# Altium footprint library MyComponents_v2.5.PcbLib: 403 footprints (part 2 of 26)
Each footprint in its own frame and in the unit in brackets; x right, y up, seen from the top. Pads: shape width x height; smd on the part's side, far side on the other; paste and mask are expansions set on the pad; w line width, h text height; cw(c..) or ccw(c..) is an arc to the next point about the centre after c.
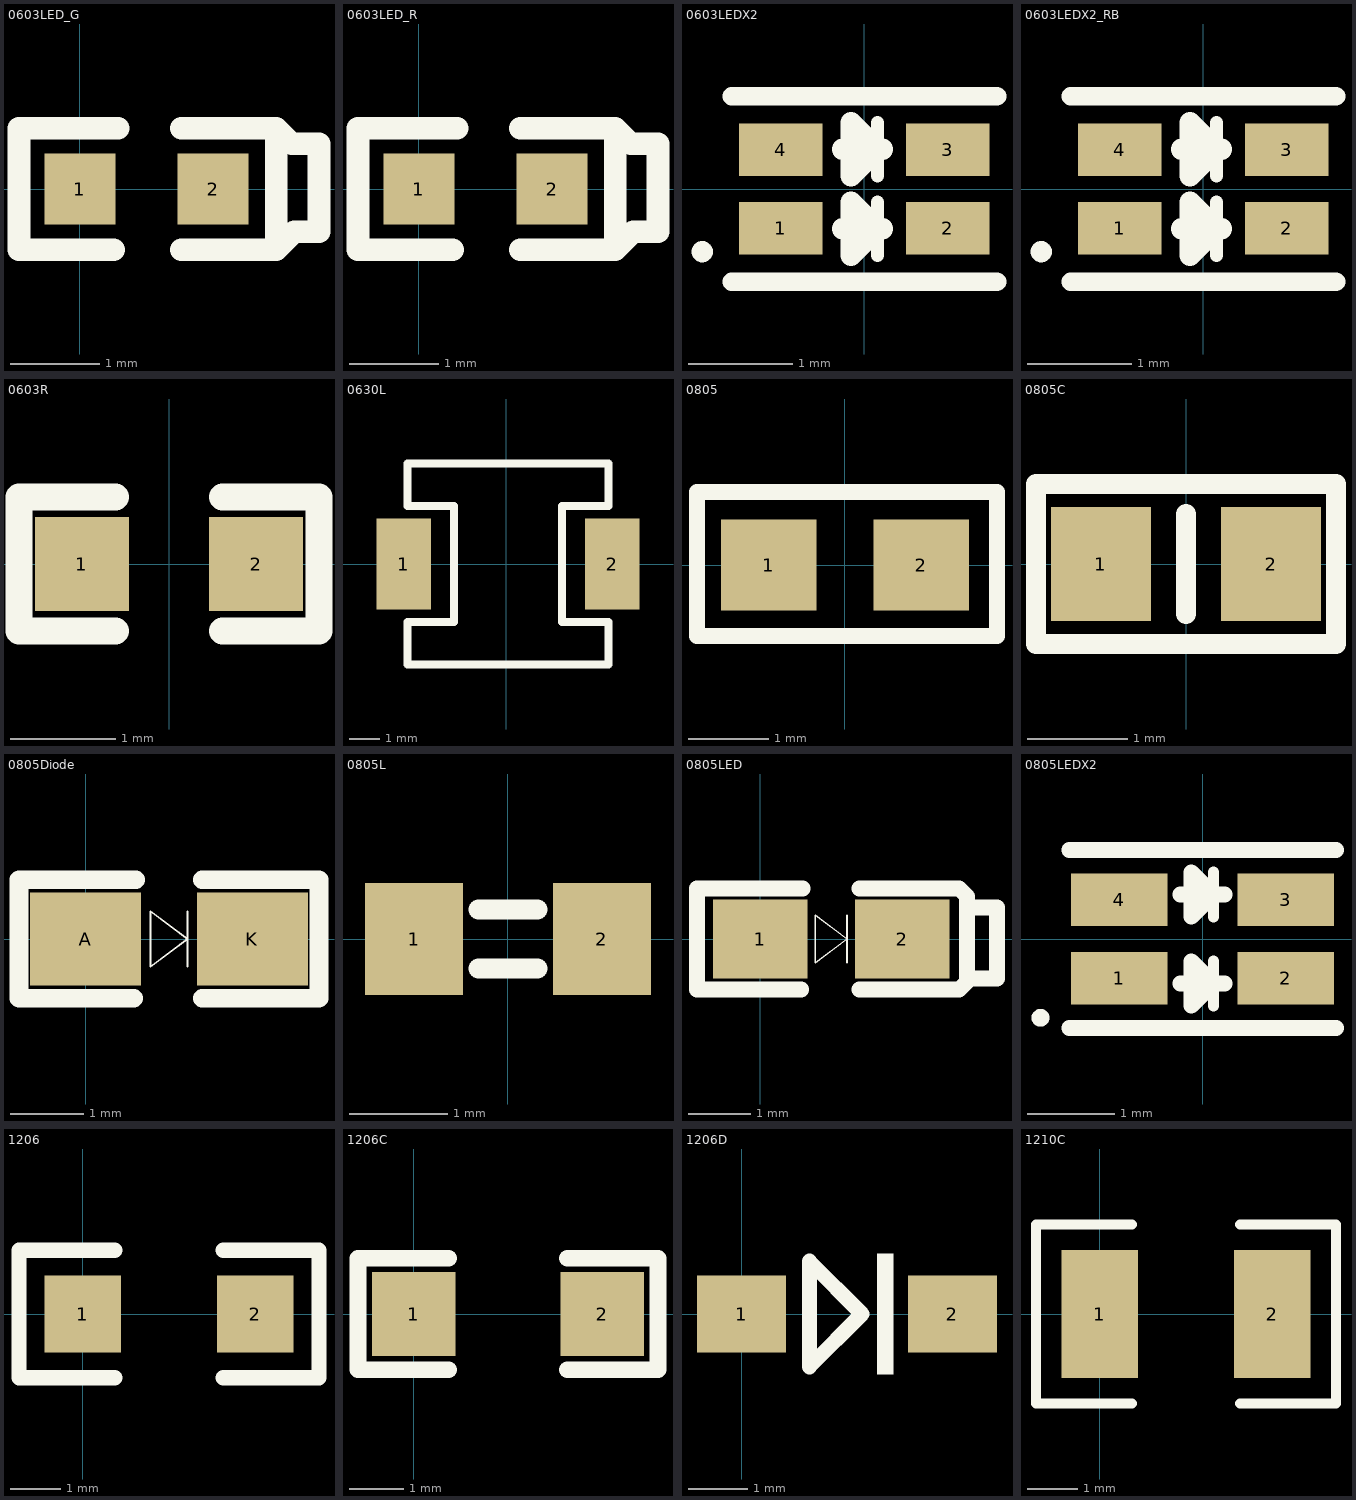
[diagram p1: the footprints below, top view; thin cyan lines are the x and y axes]

## 0603LED_G [mm]
pads (2):
  rect 0.8x0.8 smd: 1(0,0) 2(1.5,0)
Top Overlay:
  lines w0.254: 0.381,-0.686 -0.686,-0.686 -0.686,0.686 0.432,0.686 ; 1.143,-0.686 2.21,-0.686 ; 1.143,0.686 2.21,0.686 ; 2.21,-0.686 2.21,0.686 ; 2.21,-0.686 2.413,-0.483 2.692,-0.483 2.692,0.508 2.388,0.508 2.21,0.686
3D body "0603led_green.STEP": height 0.6, standoff 0, extent -0.038,-0.4 1.562,0.4

## 0603LED_R [mm]
pads (2):
  rect 0.8x0.8 smd: 1(0,0) 2(1.5,0)
Top Overlay:
  lines w0.254: 0.381,-0.686 -0.686,-0.686 -0.686,0.686 0.432,0.686 ; 1.143,-0.686 2.21,-0.686 ; 1.143,0.686 2.21,0.686 ; 2.21,-0.686 2.21,0.686 ; 2.21,-0.686 2.413,-0.483 2.692,-0.483 2.692,0.508 2.388,0.508 2.21,0.686
3D body "0603led_red.STEP": height 0.6, standoff 0, extent -0.063,-0.4 1.537,0.4

## 0603LEDX2 [mm]
pads (4):
  rect 0.8x0.5 smd: 1(-0.8,-0.375) 2(0.8,-0.375) 3(0.8,0.375) 4(-0.8,0.375)
Top Overlay:
  circle w0.102: c-1.551,-0.6 r0.051
  lines w0.127: 0.127,-0.635 0.127,-0.127 ; 0.127,0.127 0.127,0.635
  lines w0.178: -1.27,-0.889 1.27,-0.889 ; -1.27,0.889 1.27,0.889
  lines w0.203: -0.208,-0.381 0.173,-0.381 ; -0.208,0.381 0.173,0.381 ; -0.127,-0.635 -0.127,-0.127 0.127,-0.381 -0.127,-0.635 ; -0.127,0.127 0.127,0.381 -0.127,0.635 -0.127,0.127

## 0603LEDX2_RB [mm]
pads (4):
  rect 0.8x0.5 smd: 1(-0.8,-0.375) 2(0.8,-0.375) 3(0.8,0.375) 4(-0.8,0.375)
Top Overlay:
  circle w0.102: c-1.551,-0.6 r0.051
  lines w0.127: 0.127,-0.635 0.127,-0.127 ; 0.127,0.127 0.127,0.635
  lines w0.178: -1.27,-0.889 1.27,-0.889 ; -1.27,0.889 1.27,0.889
  lines w0.203: -0.208,-0.381 0.173,-0.381 ; -0.208,0.381 0.173,0.381 ; -0.127,-0.635 0.127,-0.381 -0.127,-0.127 -0.127,-0.635 ; -0.127,0.127 -0.127,0.635 0.127,0.381 -0.127,0.127

## 0603R [mil] "10mil˿ӡ"
height 19.68
pads (2):
  rect 35x35 smd: 1(-32.5,0) 2(32.5,0)
Top Overlay:
  lines w10: -20,-25 -56,-25 -56,25 -20,25 ; 20,-25 56,-25 56,25 20,25
Mechanical 15:
  lines w2: 29.21,-1.42 39.21,-1.42 ; 34.21,-6.42 34.21,-1.42 34.21,3.58
3D body "0603R.step": height 22.05, standoff 0, extent -33.46,-15.74 33.47,15.75

## 0630L [mm] "一体成型贴片电感"
height 3
pads (2):
  rect 1.8x3 smd: 1(-3.369,0) 2(3.489,0)
Top Overlay:
  lines w0.254: 3.362,-2.159 3.362,-3.302 ; 3.362,-3.302 3.362,-1.905 1.838,-1.905 1.838,1.905 3.362,1.905 3.362,3.302 0.06,3.302 -3.242,3.302 -3.242,1.905 -1.718,1.905 -1.718,-1.905 -3.242,-1.905 -3.242,-3.302 3.362,-3.302
3D body "Coilcraft-XAL6030.step": height 3.15, standoff 0.05, extent -3.28,-3.38 3.28,3.38

## 0805 [mm]
pads (2):
  rect 1.2x1.14 smd: 1(-0.955,0) 2(0.955,0)
Top Overlay:
  lines w0.2: -1.854,-0.889 -1.854,-0.369 -1.854,0.914 1.905,0.914 1.905,-0.889 -1.854,-0.889
3D body "RES0805.step": height 0.8, standoff 0, extent -1.4,-0.625 1.4,0.625

## 0805C [mm]
pads (2):
  rect 1x1.14 smd: 1(-0.85,0) 2(0.85,0)
Top Overlay:
  lines w0.2: 0,-0.5 0,0.5 ; -1.5,-0.8 1.5,-0.8 1.5,0.8 -1.5,0.8 -1.5,-0.8
3D body "C0805-2.step": height 0.8, standoff 0, extent -1,-0.625 1,0.625

## 0805Diode [mil]
pads (2):
  rect 60x50 smd: A(0,0) K(90,0)
Top Overlay:
  lines w1: 55,-15 55,15 ; 35,-15 35,15 55,0 35,-15
  lines w10: 26,-32 -36,-32 -36,-1 -36,32 27,32 ; 63,-32 126,-32 126,32 63,32

## 0805L [mm]
pads (2):
  rect 1x1.14 smd: 1(-0.955,0) 2(0.955,0)
Top Overlay:
  lines w0.2: -0.3,-0.3 0.3,-0.3 ; -0.3,0.3 0.3,0.3
3D body "0805L.stp": height 0.49, standoff -0.01, extent -1,-0.625 1,0.625

## 0805LED [mil]
pads (2):
  rect 60x50 smd: 1(0,0) 2(90,0)
Top Overlay:
  lines w1: 55,-15 55,15 ; 35,-15 55,0 35,15 35,-15
  lines w10: 26,-32 -40,-32 -40,32 27,32 ; 63,-32 126,-32 131,-27 ; 63,32 126,32 131,27 131,-27 ; 131,20 150,20 150,-25 133,-25 131,-27
3D body "LED0805.step": height 31.5, standoff 0, extent 3.66,-26.58 86.34,26.58

## 0805LEDX2 [mm] "double_color"
pads (4):
  rect 1.1x0.6 smd: 1(-0.95,-0.45) 2(0.95,-0.45) 3(0.95,0.45) 4(-0.95,0.45)
Top Overlay:
  circle w0.102: c-1.851,-0.9 r0.051
  lines w0.127: 0.127,-0.762 0.127,-0.254 ; 0.127,0.254 0.127,0.762
  lines w0.178: -1.524,-1.016 1.524,-1.016 ; -1.524,1.016 1.524,1.016 ; -0.254,-0.508 0.254,-0.508 ; -0.254,0.508 0.254,0.508 ; -0.127,-0.762 0.127,-0.508 -0.127,-0.254 -0.127,-0.762 ; -0.127,0.254 -0.127,0.762 0.127,0.508 -0.127,0.254
3D body "0805led double.STEP": height 1, standoff 0, extent -1.059,-0.588 0.94,0.607

## 1206 [mil]
pads (2):
  rect 60x60 smd: 1(0,0) 2(135,0)
Top Overlay:
  lines w12: 25,-50 -50,-50 -50,50 25,50 ; 110,-50 185,-50 185,50 110,50
3D body "User Library-RES1206-2.step": height 21.65, standoff 0, extent 8.75,-30.51 127.25,30.52

## 1206C [mil]
pads (2):
  rect 60x60 smd: 1(0,0) 2(135,0)
Top Overlay:
  lines w12: 25,-40 -40,-40 -40,40 25,40 ; 110,-40 175,-40 175,40 110,40
3D body "1206C.stp": height 70.63, standoff -0.23, extent -3.94,-39.37 141.73,37.4

## 1206D [mm] "稳压管，1N4148"
pads (2):
  rect 1.5x1.3 smd: 1(0,0) 2(3.556,0)
Top Overlay:
  rectangle: 2.286,-1.016 2.559,1.016
  lines w0.254: 1.143,-0.889 2.032,0 1.143,0.889 1.143,-0.889

## 1210C [mil]
pads (2):
  rect 60x100 smd: 1(0,0) 2(135,0)
Top Overlay:
  lines w8: 25,-70 -50,-70 -50,70 25,70 ; 110,-70 185,-70 185,70 110,70
3D body "1210C.stp": height 108.5, standoff -1.74, extent -8.84,-55 136.83,59.17